# Altium schematic symbol library Schlib.SchLib: 725 symbols (part 5 of 6) (continued)
## SMAJ6.0A (continued)
SMAJ Series 10.3 V 0.4 kW Surface Mount Uni-Directional TVS Diode - DO-214AC; Manufacturer: Littelfuse; Manufacturer Part Number: SMAJ6.0A; Number of Channels: 1; Direction: Unidirectional; Clamping Voltage: 96.8V; Breakdown Voltage: 66.7V; Operating Supply Voltage: 60V; Max Surge Current: 4.1A; Reverse Standoff Voltage: 6V; Min Breakdown Voltage: 6.67V; Peak Pulse Power: 400W; Power Line Protection: No; Peak Pulse Current: 38.8A; Test Current: 1mA; Diode Type: ZENER; Max Power Dissipation: 3.3W; Max Breakdown Voltage: 7.37V; Leakage Current: 1uA; Current: 41A; Clamping Voltage-Max: 10.3V; Supplier: Future Electronics; Supplier Part Number: 9439142; RoHS: Yes; Category: TVS Diodes; Stock: 10000; Pricing: 5000=0.068, 15000=0.0655, 20000=0.0648, 50000=0.0628, 75000=0.0608 (USD); Mounting Technology: Surface Mount; Case/Package: DO-214AC; Pins: 2; Min Operating Temperature: -65°C; Max Operating Temperature: 150°C; Package Quantity: 5000; Packaging: Tape and Reel; Number of Unidirectional Channels: 1; Polarity: Unidirectional; Termination: SMD/SMT; Series: SMAJ; Voltage Rating (DC): 6V; Reverse Breakdown Voltage: 66.7V; Number of Elements: 1; Voltage: 60V; Power Dissipation: 400W; Length: 5.28mm; Width: 2.79mm; Height: 2.29mm; RoHS Compliant: Yes; Reach SVHC Compliant: No; Lead Free: Lead Free; ComponentLink1URL: https://datasheet.ciiva.com/28473/607617-28473464.pdf?src-supplier=Element14; ComponentLink1Description: https://datasheet.ciiva.com/28473/607617-28473464.pdf?src-supplier=Element14; ComponentLink2URL: https://datasheet.ciiva.com/330/littelfuse-tvs-diode-smaj-datasheet-pdf-330723.pdf?src-supplier=Digikey; ComponentLink2Description: https://datasheet.ciiva.com/330/littelfuse-tvs-diode-smaj-datasheet-pdf-330723.pdf?src-supplier=Digikey; ComponentLink3URL: https://datasheet.ciiva.com/330/littelfuse-tvs-diode-smaj-datasheet-pdf-330721.pdf?src-supplier=Digikey; ComponentLink3Description: https://datasheet.ciiva.com/330/littelfuse-tvs-diode-smaj-datasheet-pdf-330721.pdf?src-supplier=Digikey; ComponentLink4URL: https://datasheet.ciiva.com/16391/littelfuse-tvs-diode-smaj-16391801.pdf?src-supplier=Future+Electronics; ComponentLink4Description: https://datasheet.ciiva.com/16391/littelfuse-tvs-diode-smaj-16391801.pdf?src-supplier=Future+Electronics; ComponentLink5URL: https://datasheet.ciiva.com/330/littelfuse-tvs-diode-smaj-datasheet-pdf-330713.pdf?src-supplier=Digikey; ComponentLink5Description: https://datasheet.ciiva.com/330/littelfuse-tvs-diode-smaj-datasheet-pdf-330713.pdf?src-supplier=Digikey; ComponentLink6URL: https://datasheet.ciiva.com/330/littelfuse-tvs-diode-smaj-datasheet-pdf-330712.pdf?src-supplier=Digikey; ComponentLink6Description: https://datasheet.ciiva.com/330/littelfuse-tvs-diode-smaj-datasheet-pdf-330712.pdf?src-supplier=Digikey; ComponentLink7URL: https://datasheet.ciiva.com/16487/littelfuse-tvs-diode-smaj-16487499.pdf?src-supplier=Future+Electronics; ComponentLink7Description: https://datasheet.ciiva.com/16487/littelfuse-tvs-diode-smaj-16487499.pdf?src-supplier=Future+Electronics; ComponentLink8URL: https://datasheet.ciiva.com/330/littelfuse-tvs-diode-smaj-datasheet-pdf-330722.pdf?src-supplier=Digikey; ComponentLink8Description: https://datasheet.ciiva.com/330/littelfuse-tvs-diode-smaj-datasheet-pdf-330722.pdf?src-supplier=Digikey
footprint DO-214AC, SMA
pins: 1 C, 2 A

## SMAJ26CA
designator D?  (value not drawn)
SMAJ Series 42.1 V 0.4 kW Surface Mount Bi-Directional TVS Diode - DO-214AC; Manufacturer: Littelfuse; Manufacturer Part Number: SMAJ26CA; Reverse Standoff Voltage: 26V; Min Breakdown Voltage: 28.9V; Peak Pulse Power: 400W; Polarity: Bidirectional; Peak Pulse Current: 9.5A; Max Power Dissipation: 3.3W; Clamping Voltage: 42.1V; Test Current: 1mA; Max Breakdown Voltage: 31.9V; Number of Elements: 1; Leakage Current: 1uA; Power Line Protection: No; Diode Type: ZENER; Supplier: Future Electronics; Supplier Part Number: 8355760; RoHS: Yes; Category: TVS Diodes; Stock: 50000; Pricing: 5000=0.0746, 15000=0.0718, 20000=0.0711, 50000=0.0689, 75000=0.0667 (USD); Mounting Technology: Surface Mount; Case/Package: DO-214AC; Pins: 2; Min Operating Temperature: -65°C; Max Operating Temperature: 150°C; Packaging: Tape and Reel; Direction: Bidirectional; Reverse Breakdown Voltage: 28.9V; Number of Bidirectional Channels: 1; Power Dissipation: 400W; Voltage Rating (DC): 26V; Series: SMAJ; Clamping Voltage-Max: 42.1V; Length: 5.28mm; Width: 2.79mm; Height: 2.29mm; RoHS Compliant: Yes; Reach SVHC Compliant: No; Lead Free: Lead Free; ComponentLink1URL: https://datasheet.ciiva.com/331/littelfuse-tvs-diode-smaj-datasheet-pdf-331088.pdf?src-supplier=Digikey; ComponentLink1Description: https://datasheet.ciiva.com/331/littelfuse-tvs-diode-smaj-datasheet-pdf-331088.pdf?src-supplier=Digikey; ComponentLink2URL: https://datasheet.ciiva.com/331/littelfuse-tvs-diode-smaj-datasheet-pdf-331089.pdf?src-supplier=Digikey; ComponentLink2Description: https://datasheet.ciiva.com/331/littelfuse-tvs-diode-smaj-datasheet-pdf-331089.pdf?src-supplier=Digikey; ComponentLink3URL: https://datasheet.ciiva.com/331/littelfuse-tvs-diode-smaj-datasheet-pdf-331087.pdf?src-supplier=Digikey; ComponentLink3Description: https://datasheet.ciiva.com/331/littelfuse-tvs-diode-smaj-datasheet-pdf-331087.pdf?src-supplier=Digikey
footprint DO-214AC, SMA
pins: 1 C, 2 A

## SMAJ30A
designator *
Diode TVS Single Uni-Dir 30V 400W 2-Pin SMA; Manufacturer: Bourns; Manufacturer Part Number: SMAJ30A; Supplier: Digikey; Supplier Part Number: SMAJ30ABCT-ND; RoHS: Yes; Category: TVS Diodes; Stock: 6259; Pricing: 1=0.35, 10=0.233, 100=0.113, 500=0.1075, 1000=0.102 (USD); ComponentLink1URL: https://datasheet.ciiva.com/333/smaj-333554.pdf?src-supplier=Digikey; ComponentLink1Description: https://datasheet.ciiva.com/333/smaj-333554.pdf?src-supplier=Digikey; ComponentLink2URL: https://datasheet.ciiva.com/333/smaj-333555.pdf?src-supplier=Digikey; ComponentLink2Description: https://datasheet.ciiva.com/333/smaj-333555.pdf?src-supplier=Digikey; ComponentLink3URL: https://datasheet.ciiva.com/333/smaj-333556.pdf?src-supplier=Digikey; ComponentLink3Description: https://datasheet.ciiva.com/333/smaj-333556.pdf?src-supplier=Digikey; ComponentLink4URL: https://datasheet.ciiva.com/8199/smaj-8199689.pdf?src-supplier=Avnet; ComponentLink4Description: https://datasheet.ciiva.com/8199/smaj-8199689.pdf?src-supplier=Avnet; ComponentLink5URL: https://datasheet.ciiva.com/3021/smaj-3021390.pdf?src-supplier=Avnet; ComponentLink5Description: https://datasheet.ciiva.com/3021/smaj-3021390.pdf?src-supplier=Avnet; ComponentLink6URL: https://datasheet.ciiva.com/16237/smaj-16237422.pdf?src-supplier=Onlinecomponents.com; ComponentLink6Description: https://datasheet.ciiva.com/16237/smaj-16237422.pdf?src-supplier=Onlinecomponents.com; ComponentLink7URL: https://datasheet.ciiva.com/28409/1695388-28409902.pdf?src-supplier=Element14; ComponentLink7Description: https://datasheet.ciiva.com/28409/1695388-28409902.pdf?src-supplier=Element14; ComponentLink8URL: https://datasheet.ciiva.com/8031/1695388-8031049.pdf?src-supplier=Element14; ComponentLink8Description: https://datasheet.ciiva.com/8031/1695388-8031049.pdf?src-supplier=Element14

## SMAJ30A-TP
designator D?  (value not drawn)
TVS Diode Single Uni-Dir 30V 400W 2-Pin SMA T/R; Manufacturer: MCC; Manufacturer Part Number: SMAJ30A-TP; Reverse Breakdown Voltage: 33.3V; Max Surge Current: 8.3A; Number of Unidirectional Channels: 1; Clamping Voltage: 48.4V; Power Line Protection: No; Polarity: Unidirectional; Test Current: 1mA; Leakage Current: 1uA; Diode Type: ZENER; Supplier: Arrow Electronics; Supplier Part Number: SMAJ30A-TP; RoHS: Yes; Category: TVS Diodes; Stock: 10000; Pricing: 5000=0.0648, 10000=0.0535, 50000=0.0512 (USD); Mounting Technology: Surface Mount; Case/Package: DO-214AC; Pins: 2; Min Operating Temperature: -55°C; Max Operating Temperature: 150°C; Package Quantity: 5000; Packaging: Tape and Reel; Operating Supply Voltage: 30V; Reverse Standoff Voltage: 30V; Min Breakdown Voltage: 33.3V; Peak Pulse Power: 400W; Breakdown Voltage: 33.3V; Number of Channels: 1; Termination: SMD/SMT; Number of Elements: 1; Peak Pulse Current: 8.3A; Voltage Rating (DC): 30V; Series: -; Length: 4.6mm; Width: 2.9mm; Height: 2.44mm; Lead Free: Lead Free; RoHS Compliant: Yes; ComponentLink1URL: https://datasheet.ciiva.com/333/smaj5-0smaj440casma-333617.pdf?src-supplier=Digikey; ComponentLink1Description: https://datasheet.ciiva.com/333/smaj5-0smaj440casma-333617.pdf?src-supplier=Digikey; ComponentLink2URL: https://datasheet.ciiva.com/333/smaj5-0smaj440casma-333618.pdf?src-supplier=Digikey; ComponentLink2Description: https://datasheet.ciiva.com/333/smaj5-0smaj440casma-333618.pdf?src-supplier=Digikey; ComponentLink3URL: https://datasheet.ciiva.com/333/smaj5-0smaj440casma-333619.pdf?src-supplier=Digikey; ComponentLink3Description: https://datasheet.ciiva.com/333/smaj5-0smaj440casma-333619.pdf?src-supplier=Digikey
footprint DO-214AC, SMA
pins: 1 C, 2 A

## SMAJ30CA
designator D?  (value not drawn)
Dio Tvs Vwm 30V 400W Bidir Sma Rohs Compliant: Yes; Manufacturer: Bourns; Manufacturer Part Number: SMAJ30CA; Polarity: Bidirectional; Breakdown Voltage: 36.8V; Min Breakdown Voltage: 33.3V; Test Current: 1mA; Peak Pulse Current: 8.3A; Max Surge Current: 40A; Number of Bidirectional Channels: 1; Power Line Protection: No; Max Reverse Leakage Current: 5uA; Diode Type: ZENER; Operating Supply Voltage: 3.5V; Supplier: Rs; Supplier Part Number: 7673740P; RoHS: Yes; Category: TVS Diodes; Stock: 48677; Pricing: 500=0.17, 2500=0.104, 5000=0.102, 10000=0.099 (GBP); Mounting Technology: Surface Mount; Case/Package: DO-214AC; Pins: 2; Min Operating Temperature: -55°C; Max Operating Temperature: 150°C; Peak Pulse Power: 400W; Packaging: Tape and Reel; Reverse Standoff Voltage: 30V; Direction: Bidirectional; Package Quantity: 1; Series: SMAJ; Number of Channels: 1; Max Power Dissipation: 400W; Termination: SMD/SMT; Max Breakdown Voltage: 36.8V; ESD Protection: Yes; Length: 4.57mm; Width: 2.92mm; Height: 2.42mm; Radiation Hardening: No; RoHS Compliant: Yes; Reach SVHC Compliant: No; ComponentLink1URL: https://datasheet.ciiva.com/25624/0900766b8112213b-25624855.pdf?src-supplier=Rs; ComponentLink1Description: https://datasheet.ciiva.com/25624/0900766b8112213b-25624855.pdf?src-supplier=Rs; ComponentLink2URL: https://datasheet.ciiva.com/8031/1695388-8031052.pdf?src-supplier=Element14; ComponentLink2Description: https://datasheet.ciiva.com/8031/1695388-8031052.pdf?src-supplier=Element14; ComponentLink3URL: https://datasheet.ciiva.com/3023/smaj-3023089.pdf?src-supplier=Avnet; ComponentLink3Description: https://datasheet.ciiva.com/3023/smaj-3023089.pdf?src-supplier=Avnet; ComponentLink4URL: https://datasheet.ciiva.com/16237/smaj-16237423.pdf?src-supplier=Onlinecomponents.com; ComponentLink4Description: https://datasheet.ciiva.com/16237/smaj-16237423.pdf?src-supplier=Onlinecomponents.com; ComponentLink5URL: https://datasheet.ciiva.com/3021/smaj-3021391.pdf?src-supplier=Avnet; ComponentLink5Description: https://datasheet.ciiva.com/3021/smaj-3021391.pdf?src-supplier=Avnet; ComponentLink6URL: https://datasheet.ciiva.com/334/smaj-334475.pdf?src-supplier=Digi-Key; ComponentLink6Description: https://datasheet.ciiva.com/334/smaj-334475.pdf?src-supplier=Digi-Key; ComponentLink7URL: https://datasheet.ciiva.com/334/smaj-334476.pdf?src-supplier=Digi-Key; ComponentLink7Description: https://datasheet.ciiva.com/334/smaj-334476.pdf?src-supplier=Digi-Key; ComponentLink8URL: https://datasheet.ciiva.com/334/smaj-334474.pdf?src-supplier=Digi-Key; ComponentLink8Description: https://datasheet.ciiva.com/334/smaj-334474.pdf?src-supplier=Digi-Key
footprint DO-214AC, SMA
pins: 1 C, 2 A

## SMAJ60A-E3/61
designator D?  (value not drawn)
400 W 60 V Uni-Directional SMT Transient Voltage Suppressor Diode - DO-214AC; Manufacturer: Vishay Semiconductors; Manufacturer Part Number: SMAJ60A-E3/61; Voltage Rating (DC): 60V; Supplier: Rs; Supplier Part Number: 8141427; RoHS: Yes; Category: TVS Diodes; Stock: 12180; Pricing: 20=0.264, 200=0.214, 1000=0.19, 2000=0.148, 5000=0.131 (EUR); Lead Free: 5697LeadFree; ComponentLink1URL: https://datasheet.ciiva.com/15143/getdatasheetpartid-185225-15143901.pdf?src-supplier=Verical; ComponentLink1Description: https://datasheet.ciiva.com/15143/getdatasheetpartid-185225-15143901.pdf?src-supplier=Verical; ComponentLink2URL: https://datasheet.ciiva.com/26322/548547-26322565.pdf?src-supplier=Element14; ComponentLink2Description: https://datasheet.ciiva.com/26322/548547-26322565.pdf?src-supplier=Element14; ComponentLink3URL: https://datasheet.ciiva.com/16487/smaj50a-16487487.pdf?src-supplier=Future+Electronics; ComponentLink3Description: https://datasheet.ciiva.com/16487/smaj50a-16487487.pdf?src-supplier=Future+Electronics
footprint DO-214AC, SMA
pins: 1 C, 2 A

## SMBJ26CA
designator D?  (value not drawn)
Diode TVS Single Bi-Dir 26V 600W 2-Pin DO-214AA T/R; Manufacturer: Bourns; Manufacturer Part Number: SMBJ26CA; Supplier: Avnet; Supplier Part Number: SMBJ26CA; RoHS: Yes; Category: TVS Diodes; Stock: 18000; Pricing: 3000=0.0994, 6000=0.0973, 12000=0.0952, 18000=0.0931, 24000=0.091, 30000=0.0889, 300000=0.0875 (USD); Height: 2.44mm; ComponentLink1URL: https://datasheet.ciiva.com/3021/smbj-3021431.pdf?src-supplier=Avnet; ComponentLink1Description: https://datasheet.ciiva.com/3021/smbj-3021431.pdf?src-supplier=Avnet; ComponentLink2URL: https://datasheet.ciiva.com/3022/smbj-3022511.pdf?src-supplier=Avnet; ComponentLink2Description: https://datasheet.ciiva.com/3022/smbj-3022511.pdf?src-supplier=Avnet; ComponentLink3URL: https://datasheet.ciiva.com/4509/smbj-51809-4509304.pdf?src-supplier=Mouser; ComponentLink3Description: https://datasheet.ciiva.com/4509/smbj-51809-4509304.pdf?src-supplier=Mouser; ComponentLink4URL: https://datasheet.ciiva.com/334/smbj-334676.pdf?src-supplier=Digikey; ComponentLink4Description: https://datasheet.ciiva.com/334/smbj-334676.pdf?src-supplier=Digikey; ComponentLink5URL: https://datasheet.ciiva.com/334/smbj-334677.pdf?src-supplier=Digikey; ComponentLink5Description: https://datasheet.ciiva.com/334/smbj-334677.pdf?src-supplier=Digikey; ComponentLink6URL: https://datasheet.ciiva.com/334/smbj-334678.pdf?src-supplier=Digikey; ComponentLink6Description: https://datasheet.ciiva.com/334/smbj-334678.pdf?src-supplier=Digikey; ComponentLink7URL: https://datasheet.ciiva.com/8031/1677318-8031151.pdf?src-supplier=Element14; ComponentLink7Description: https://datasheet.ciiva.com/8031/1677318-8031151.pdf?src-supplier=Element14; ComponentLink8URL: https://datasheet.ciiva.com/16237/smbj-16237495.pdf?src-supplier=Onlinecomponents.com; ComponentLink8Description: https://datasheet.ciiva.com/16237/smbj-16237495.pdf?src-supplier=Onlinecomponents.com
footprint DO-214AA_SMB
pins: 1 C, 2 A

## SMBJ30CAHE3/52
designator D?  (value not drawn)
Diode TVS Single Bi-Dir 30V 600W 2-Pin DO-214AA T/R; Manufacturer: Vishay Semiconductors; Manufacturer Part Number: SMBJ30CAHE3/52; Direction: Bidirectional; Min Breakdown Voltage: 33.3V; Max Reverse Leakage Current: 1uA; Test Current: 1mA; Peak Pulse Current: 12.4A; Clamping Voltage: 48.4V; Number of Bidirectional Channels: 1; Power Line Protection: No; Diode Type: ZENER; Max Surge Current: 100A; Supplier: Digikey; Supplier Part Number: SMBJ30CAHE3/52GIDKR-ND; RoHS: Yes; Category: TVS Diodes; Mounting Technology: Surface Mount; Case/Package: DO-214AA; Pins: 2; Min Operating Temperature: -55°C; Max Operating Temperature: 150°C; Packaging: Tape and Reel; Peak Pulse Power: 600W; Reverse Standoff Voltage: 30V; Polarity: Bidirectional; Series: Automotive, AEC-Q101, TransZorb®; Package Quantity: 750; Operating Supply Voltage: 30V; Breakdown Voltage: 33.3V; Number of Channels: 1; Termination: SMD/SMT; RoHS Compliant: Yes; ComponentLink1URL: https://datasheet.ciiva.com/347/smbj50a-347563.pdf?src-supplier=Digikey; ComponentLink1Description: https://datasheet.ciiva.com/347/smbj50a-347563.pdf?src-supplier=Digikey
footprint DO-214AC, SMA
pins: 1 C, 2 A

## SMF5.0CA
designator D?  (value not drawn)
Transient Voltage Suppressor diode, SOD-123FL, 6.40V .. 7.00V, 200W; Manufacturer: Diotec; Manufacturer Part Number: SMF5.0CA; Supplier: Mouser; Supplier Part Number: 637-SMF5.0CA; RoHS: Yes; Category: TVS Diodes; Stock: 2535; Pricing: 1=0.61, 10=0.426, 50=0.426, 100=0.265, 1000=0.234, 10000=0.095 (USD); ComponentLink1URL: https://datasheet.octopart.com/SMF5.0CA-Diotec-datasheet-155920028.pdf?src-supplier=TME; ComponentLink1Description: https://datasheet.octopart.com/SMF5.0CA-Diotec-datasheet-155920028.pdf?src-supplier=TME
footprint SOD-123F
pins: 1 C, 2 A

## SMF6.0A
designator D?  (value not drawn)
SMF Series 7.37 V Uni-Directional Surface Mount TVS Diode - SOD-123F; Manufacturer: Diotec; Manufacturer Part Number: SMF6.0A; Supplier: Mouser; Supplier Part Number: 637-SMF6.0A; RoHS: Yes; Category: TVS Diodes; Stock: 1735; Pricing: 1=0.25, 10=0.134, 50=0.134, 100=0.087, 1000=0.051, 10000=0.032 (USD); ComponentLink1URL: https://datasheet.octopart.com/SMF6.0A-Diotec-datasheet-155920028.pdf?src-supplier=TME; ComponentLink1Description: https://datasheet.octopart.com/SMF6.0A-Diotec-datasheet-155920028.pdf?src-supplier=TME
footprint SOD-123F
pins: 1 C, 2 A

## SMF6.0CA
designator D?  (value not drawn)
Diode TVS Single Bi-Dir 6V 1000W 2-Pin SOD-123FL T/R; Manufacturer: Littelfuse; Manufacturer Part Number: SMF6.0CA; Supplier: Digi-Key; Supplier Part Number: 18-SMF6.0CACT-ND; RoHS: Yes; Category: TVS Diodes; Stock: 7686; Pricing: 1=0.43, 10=0.352, 100=0.2399, 500=0.17992, 1000=0.13495 (USD)
footprint SOD-123F
pins: 1 C, 2 A

## SMF18CA-TP
designator D?  (value not drawn)
TVS Diode Single Bi-Dir 18V 200W 2-Pin SOD-123FL T/R; Manufacturer: MCC; Manufacturer Part Number: SMF18CA-TP; Supplier: Verical; Supplier Part Number: SMF18CA-TP; RoHS: Yes; Stock: 15000; Pricing: 2500=0.0616, 50000=0.0585, 100000=0.0567 (USD); ComponentLink1URL: http://components.arrow.com/part/dataview/49208193S300830N2022?src-supplier=Arrow+Electronics; ComponentLink1Description: http://components.arrow.com/part/dataview/49208193S300830N2022?src-supplier=Arrow+Electronics; ComponentLink2URL: https://datasheet.octopart.com/SMF18CA-TP-MCC-datasheet-136499538.pdf?src-supplier=TME; ComponentLink2Description: https://datasheet.octopart.com/SMF18CA-TP-MCC-datasheet-136499538.pdf?src-supplier=TME
footprint SOD-123F
pins: 1 C, 2 A

## SMF20CA
designator D?  (value not drawn)
TVS Diode, SOD-123FL, 20.0V, 200W, Bidir; Manufacturer: Diotec; Manufacturer Part Number: SMF20CA; Supplier: Mouser; Supplier Part Number: 637-SMF20CA; RoHS: No; Stock: 4391; Pricing: 1=0.32, 10=0.318, 50=0.318, 100=0.318, 1000=0.215, 10000=0.072 (USD); ComponentLink1URL: http://datasheet.octopart.com/SMF20CA-Diotec-datasheet-155920028.pdf?src-supplier=Mouser; ComponentLink1Description: http://datasheet.octopart.com/SMF20CA-Diotec-datasheet-155920028.pdf?src-supplier=Mouser; ComponentLink2URL: http://datasheet.octopart.com/SMF20CA-Diotec-datasheet-155920028.pdf?src-supplier=Onlinecomponents.com; ComponentLink2Description: http://datasheet.octopart.com/SMF20CA-Diotec-datasheet-155920028.pdf?src-supplier=Onlinecomponents.com; ComponentLink3URL: http://datasheet.octopart.com/SMF20CA-Diotec-datasheet-155920028.pdf?src-supplier=Electro+Sonic; ComponentLink3Description: http://datasheet.octopart.com/SMF20CA-Diotec-datasheet-155920028.pdf?src-supplier=Electro+Sonic; ComponentLink4URL: http://datasheet.octopart.com/SMF20CA-Diotec-datasheet-155920028.pdf?src-supplier=DComponents; ComponentLink4Description: http://datasheet.octopart.com/SMF20CA-Diotec-datasheet-155920028.pdf?src-supplier=DComponents; ComponentLink5URL: https://datasheet.octopart.com/SMF20CA-Diotec-datasheet-155920028.pdf?src-supplier=TME; ComponentLink5Description: https://datasheet.octopart.com/SMF20CA-Diotec-datasheet-155920028.pdf?src-supplier=TME
footprint SOD-123F
pins: 1 C, 2 A

## SMF24CA
designator D?  (value not drawn)
38.9V Clamp 5.1A Ipp Tvs Diode Surface Mount SOD-123F; Manufacturer: Diotec; Manufacturer Part Number: SMF24CA; Supplier: Mouser; Supplier Part Number: 637-SMF24CA; RoHS: No; Stock: 8407; Pricing: 1=0.6, 10=0.425, 50=0.425, 100=0.264, 1000=0.233, 10000=0.095 (USD); ComponentLink1URL: http://datasheet.octopart.com/SMF24CA-Diotec-datasheet-155920028.pdf?src-supplier=Onlinecomponents.com; ComponentLink1Description: http://datasheet.octopart.com/SMF24CA-Diotec-datasheet-155920028.pdf?src-supplier=Onlinecomponents.com; ComponentLink2URL: http://datasheet.octopart.com/SMF24CA-Diotec-datasheet-155920028.pdf?src-supplier=Mouser; ComponentLink2Description: http://datasheet.octopart.com/SMF24CA-Diotec-datasheet-155920028.pdf?src-supplier=Mouser; ComponentLink3URL: https://datasheet.octopart.com/SMF24CA-Diotec-datasheet-155920028.pdf?src-supplier=TME; ComponentLink3Description: https://datasheet.octopart.com/SMF24CA-Diotec-datasheet-155920028.pdf?src-supplier=TME; ComponentLink4URL: http://datasheet.octopart.com/SMF24CA-Diotec-datasheet-155920028.pdf?src-supplier=DComponents; ComponentLink4Description: http://datasheet.octopart.com/SMF24CA-Diotec-datasheet-155920028.pdf?src-supplier=DComponents; ComponentLink5URL: http://datasheet.octopart.com/SMF24CA-Diotec-datasheet-155920028.pdf?src-supplier=Electro+Sonic; ComponentLink5Description: http://datasheet.octopart.com/SMF24CA-Diotec-datasheet-155920028.pdf?src-supplier=Electro+Sonic
footprint SOD-123F
pins: 1 C, 2 A

## SMF30A
designator D?  (value not drawn)
Diode TVS Single Uni-Dir 30V 200W 2-Pin SOD-123F T/R; Manufacturer: Littelfuse; Manufacturer Part Number: SMF30A; Peak Pulse Current: 4.1A; Number of Unidirectional Channels: 1; Min Breakdown Voltage: 33.3V; Power Line Protection: No; Diode Type: ZENER; Clamping Voltage: 48.4V; Breakdown Voltage: 36.8V; Polarity: Unidirectional; Supplier: Future Electronics; Supplier Part Number: 4083400; RoHS: Yes; Category: TVS Diodes; Stock: 75000; Pricing: 3000=0.0941, 9000=0.0905, 15000=0.0889, 30000=0.0867, 60000=0.0834 (USD); Mounting Technology: Surface Mount; Pins: 2; Min Operating Temperature: -55°C; Max Operating Temperature: 150°C; Packaging: Tape and Reel; Reverse Standoff Voltage: 30V; Peak Pulse Power: 200W; Series: SMF; Number of Channels: 1; Max Surge Current: 4.1A; Termination: SMD/SMT; Max Breakdown Voltage: 36.8V; RoHS Compliant: Yes; Lead Free: Lead Free; Reach SVHC Compliant: Unknown; ComponentLink1URL: https://datasheet.ciiva.com/6578/littelfuse-tvs-diode-smf-datasheet-pdf-6578351.pdf?src-supplier=Digi-Key; ComponentLink1Description: https://datasheet.ciiva.com/6578/littelfuse-tvs-diode-smf-datasheet-pdf-6578351.pdf?src-supplier=Digi-Key
footprint SOD-123F
pins: 1 C, 2 A

## SMF51A
designator D?  (value not drawn)
SMF Series 200 W 51 V Uni-Directional Surface Mount TVS Diode - SOD-123F; Manufacturer: Littelfuse; Manufacturer Part Number: SMF51A; Test Current: 1mA; Max Reverse Leakage Current: 1uA; Max Breakdown Voltage: 62.7V; Reverse Voltage: 51V; Supplier: Digikey; Supplier Part Number: F5833CT-ND; RoHS: Yes; Category: TVS Diodes; Stock: 20274; Pricing: 1=0.35, 10=0.239, 100=0.11, 500=0.106, 1000=0.102, 3000=0.079, 6000=0.076, 9000=0.072 (USD); ComponentLink1URL: http://www.mouser.com/ds/2/240/Littelfuse_TVS_Diode_SMF_Datasheet-370132.pdf?src-supplier=Mouser; ComponentLink1Description: http://www.mouser.com/ds/2/240/Littelfuse_TVS_Diode_SMF_Datasheet-370132.pdf?src-supplier=Mouser; ComponentLink2URL: http://www.farnell.com/datasheets/2183286.pdf?src-supplier=Farnell; ComponentLink2Description: http://www.farnell.com/datasheets/2183286.pdf?src-supplier=Farnell; ComponentLink3URL: http://datasheet.octopart.com/SMF51A-Littelfuse-datasheet-68508998.pdf?src-supplier=Digikey; ComponentLink3Description: http://datasheet.octopart.com/SMF51A-Littelfuse-datasheet-68508998.pdf?src-supplier=Digikey; ComponentLink4URL: http://www.littelfuse.com/~/media/electronics/datasheets/tvs_diodes/littelfuse_tvs_diode_smf_datasheet.pdf.pdf?src-supplier=Digikey; ComponentLink4Description: http://www.littelfuse.com/~/media/electronics/datasheets/tvs_diodes/littelfuse_tvs_diode_smf_datasheet.pdf.pdf?src-supplier=Digikey; ComponentLink5URL: https://datasheet.octopart.com/SMF51A-Littelfuse-datasheet-68508998.pdf?src-supplier=Element14; ComponentLink5Description: https://datasheet.octopart.com/SMF51A-Littelfuse-datasheet-68508998.pdf?src-supplier=Element14; ComponentLink6URL: https://datasheet.octopart.com/SMF51A-Littelfuse-datasheet-32031221.pdf?src-supplier=Future+Electronics; ComponentLink6Description: https://datasheet.octopart.com/SMF51A-Littelfuse-datasheet-32031221.pdf?src-supplier=Future+Electronics; ComponentLink7URL: http://datasheet.octopart.com/SMF51A-Littelfuse-datasheet-68508998.pdf?src-supplier=Arrow+Electronics; ComponentLink7Description: http://datasheet.octopart.com/SMF51A-Littelfuse-datasheet-68508998.pdf?src-supplier=Arrow+Electronics; ComponentLink8URL: http://www.farnell.com/datasheets/2183286.pdf?src-supplier=Newark; ComponentLink8Description: http://www.farnell.com/datasheets/2183286.pdf?src-supplier=Newark; ComponentLink9URL: http://datasheet.octopart.com/SMF51A-Littelfuse-datasheet-68508998.pdf?src-supplier=Newark; ComponentLink9Description: http://datasheet.octopart.com/SMF51A-Littelfuse-datasheet-68508998.pdf?src-supplier=Newark; ComponentLink10URL: http://datasheet.octopart.com/SMF51A-Littelfuse-datasheet-68508998.pdf?src-supplier=LCSC; ComponentLink10Description: http://datasheet.octopart.com/SMF51A-Littelfuse-datasheet-68508998.pdf?src-supplier=LCSC; ComponentLink11URL: http://datasheet.octopart.com/SMF51A-Littelfuse-datasheet-68508998.pdf?src-supplier=TTI; ComponentLink11Description: http://datasheet.octopart.com/SMF51A-Littelfuse-datasheet-68508998.pdf?src-supplier=TTI
footprint SOD-123F
pins: 1 C, 2 A

## SMT-0540-T-9-R
designator *
Transducer Magnetic 3V 5X5MM SMD; Manufacturer: Projects Unlimited; Manufacturer Part Number: SMT-0540-T-9-R; Supplier: Mouser; Supplier Part Number: 665-SMT0540T9R; RoHS: No; Category: Audio Products; Stock: 2967; Pricing: 1=1.68000, 10=1.39000, 50=1.21000, 100=1.14000, 1000=0.93200, 10000=0.91400 (USD)

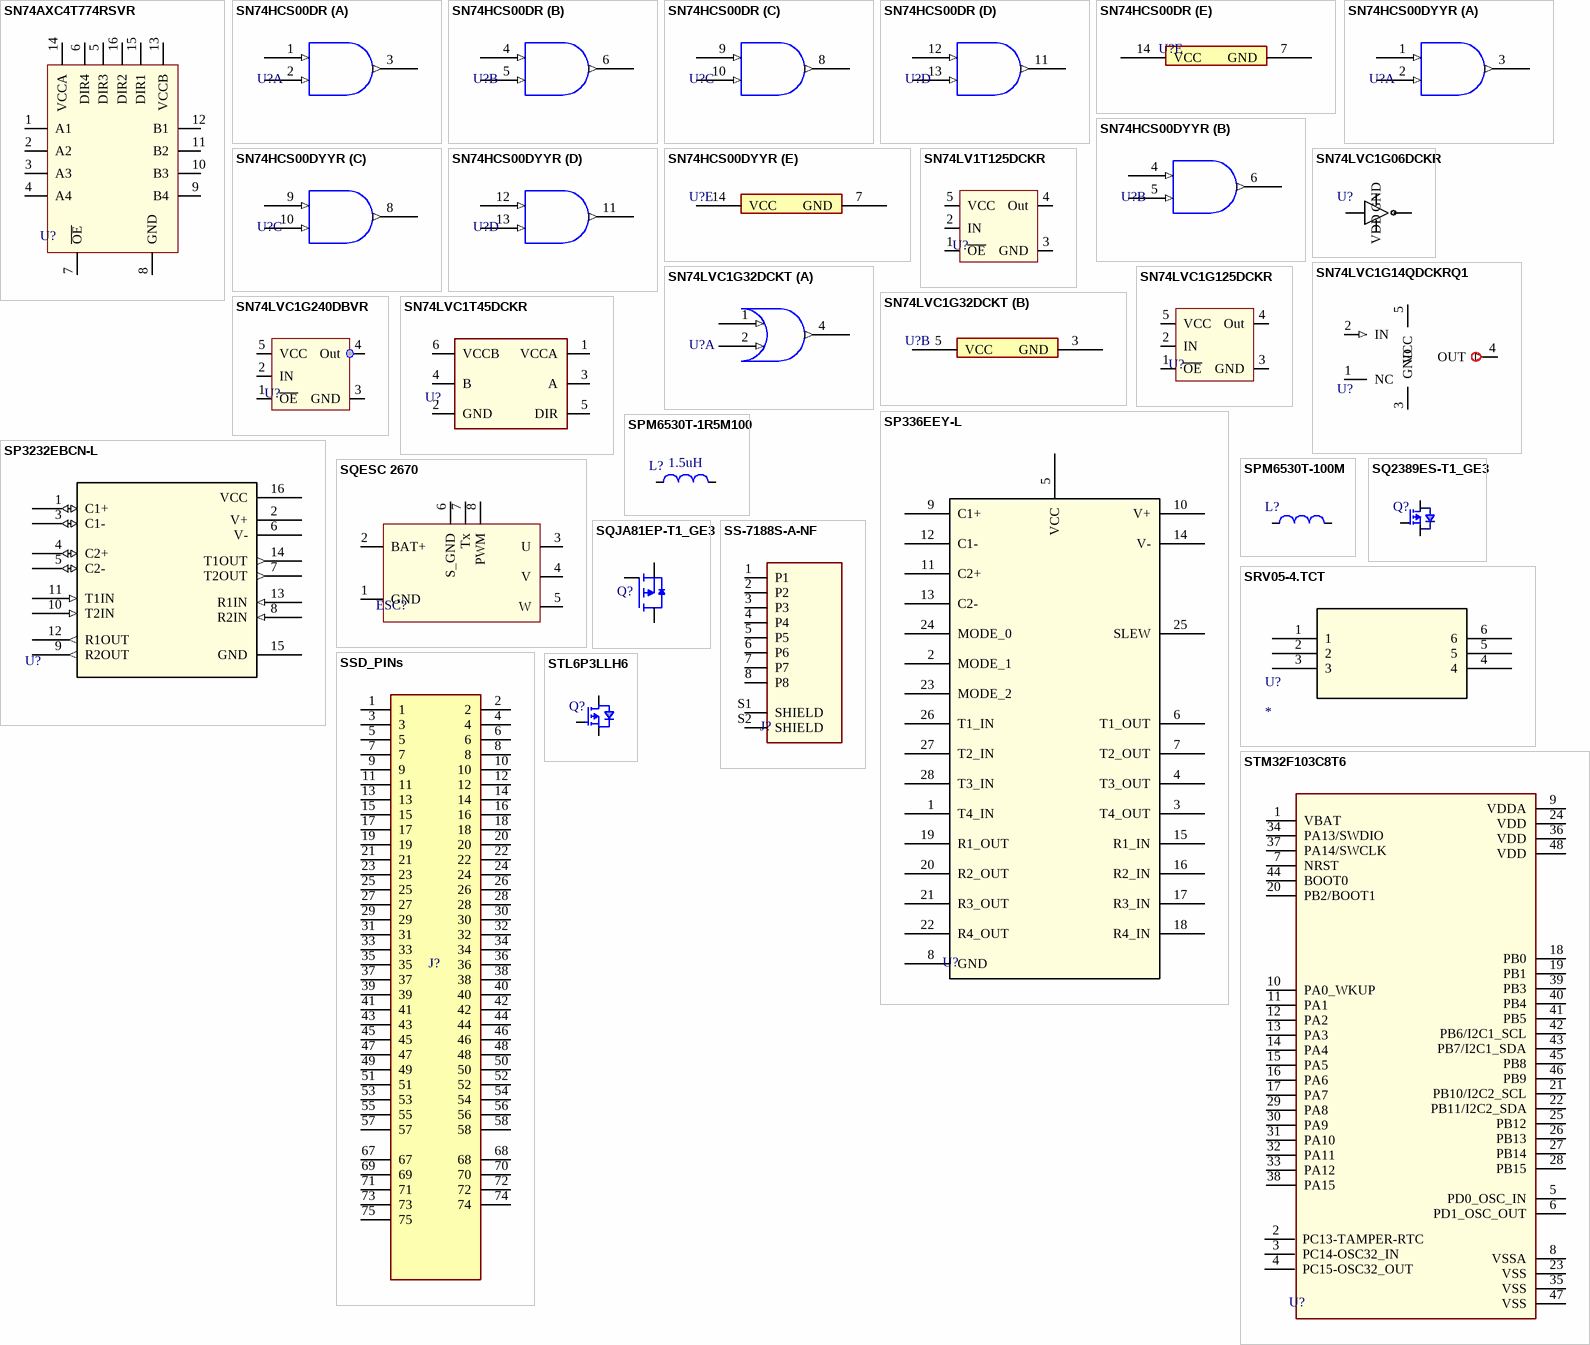
[diagram p18: symbols SN74AXC4T774RSVR to STM32F103C8T6]

## SN74AXC4T774RSVR
designator U?  (value not drawn)
4-bit dual-supply bus transceiver with 3-state outputs and independent direction control inputs 16-UQFN -40 to 125; Manufacturer: Texas Instruments; Manufacturer Part Number: SN74AXC4T774RSVR; Supplier 1: Digi-Key; RoHS: Yes; Category: Voltage Level Shifters; Stock 1: 27723; Pricing 1: 1=1.49000, 10=1.33500, 25=1.26720, 100=1.04100, 250=0.97312, 500=0.85998, 1000=0.67893 (USD); ComponentLink1URL: http://www.ti.com/general/docs/suppproductinfo.tsp?distId=10&amp;gotoUrl=http%3A%2F%2Fwww.ti.com%2Flit%2Fgpn%2Fsn74axc4t774&src-supplier=Digi-Key; ComponentLink1Description: http://www.ti.com/general/docs/suppproductinfo.tsp?distId=10&amp;gotoUrl=http%3A%2F%2Fwww.ti.com%2Flit%2Fgpn%2Fsn74axc4t774&src-supplier=Digi-Key; Supplier Part Number 1: 296-SN74AXC4T774RSVRCT-ND
footprint SN74AXC4T774RSVR
pins: 1 A1, 2 A2, 3 A3, 4 A4, 5 DIR3, 6 DIR4, 7 ~{OE}, 8 GND, 9 B4, 10 B3, 11 B2, 12 B1, 13 VCCB, 14 VCCA, 15 DIR1, 16 DIR2

## SN74HCS00DR
designator U?
4-ch, 2-input, 2-V to 6-V low power NAND gates with Schmitt-trigger inputs 14-SOIC -40 to 125; Manufacturer: Texas Instruments; Manufacturer Part Number: SN74HCS00DR; Manufacturer Lifecycle Status: ACTIVE; Supplier: Mouser; Supplier Part Number: 595-SN74HCS00DR; RoHS: Compliant; Category: Logic Gates; Stock: 6987; Pricing: 1=0.49, 10=0.342, 50=0.306, 100=0.265, 1000=0.227, 10000=0.205 (USD); Case/Package: SOIC; Height: 0m; Length: 8.65mm; Lifecycle Status: Production; Pins: 14; Thickness: 1.58mm; Width: 3.91mm; ComponentLink1URL: https://sigma.octopart.com:443/182471030/technical_drawing/Texas-Instruments-SN74HCS00DR.pdf?src-supplier=Texas+Instruments; ComponentLink1Description: https://sigma.octopart.com:443/182471030/technical_drawing/Texas-Instruments-SN74HCS00DR.pdf?src-supplier=Texas+Instruments; ComponentLink2URL: https://octopart.com:443/opatz8j6/c1?t=OK14g7H3incUNed1GC2FmLXZX_lVihb0VA9VA2M02EfhKY7Y94NoRgparx-GhwZztdg65Bsc3MiavgiTniYLOSUbm8mZzGIU70JQcTbyrEsy0z-Cu6KoiXZ_XwD20LmgepbAALutHmLKbRIqbVVhjVXZx60sRbJy0hIxps6KEDeFhfvNyS3MEr_Yo5IvxHM7oB_83x7oHqPaiGulMKrJS5_6OUNxrLRnv4svvzIWZ3tf8x9ME8p_xCWpVFMfiJgRT1sYHWo4-Y20fZuOq_0BwmmfqQEnmCBY6u-TGByjKPCvSkZK84yoSwsRKckQmdGwdlCYGl0N4qFf4yg00NBL2w561-YHZcL6807wBwxYD4CTNHdmOUm1gKXXjGbu2fZ7mpSR9mbipw&src-supplier=Texas+Instruments; ComponentLink2Description: https://octopart.com:443/opatz8j6/c1?t=OK14g7H3incUNed1GC2FmLXZX_lVihb0VA9VA2M02EfhKY7Y94NoRgparx-GhwZztdg65Bsc3MiavgiTniYLOSUbm8mZzGIU70JQcTbyrEsy0z-Cu6KoiXZ_XwD20LmgepbAALutHmLKbRIqbVVhjVXZx60sRbJy0hIxps6KEDeFhfvNyS3MEr_Yo5IvxHM7oB_83x7oHqPaiGulMKrJS5_6OUNxrLRnv4svvzIWZ3tf8x9ME8p_xCWpVFMfiJgRT1sYHWo4-Y20fZuOq_0BwmmfqQEnmCBY6u-TGByjKPCvSkZK84yoSwsRKckQmdGwdlCYGl0N4qFf4yg00NBL2w561-YHZcL6807wBwxYD4CTNHdmOUm1gKXXjGbu2fZ7mpSR9mbipw&src-supplier=Texas+Instruments; ComponentLink3URL: https://sigma.octopart.com:443/49249646/technical_drawing/Texas-Instruments-SN74HCS00DR.pdf?src-supplier=Texas+Instruments; ComponentLink3Description: https://sigma.octopart.com:443/49249646/technical_drawing/Texas-Instruments-SN74HCS00DR.pdf?src-supplier=Texas+Instruments; ComponentLink4URL: https://datasheet.octopart.com:443/SN74HCS00DR-Texas-Instruments-datasheet-164417370.pdf?src-supplier=Augswan; ComponentLink4Description: https://datasheet.octopart.com:443/SN74HCS00DR-Texas-Instruments-datasheet-164417370.pdf?src-supplier=Augswan; ComponentLink5URL: http://sigma.octopart.com:80/reach_statement/Texas-Instruments-company-64.pdf?src-supplier=Compliance+Statements; ComponentLink5Description: http://sigma.octopart.com:80/reach_statement/Texas-Instruments-company-64.pdf?src-supplier=Compliance+Statements; ComponentLink6URL: http://sigma.octopart.com:80/conflict_mineral_statement/Texas-Instruments-company-63.pdf?src-supplier=Compliance+Statements; ComponentLink6Description: http://sigma.octopart.com:80/conflict_mineral_statement/Texas-Instruments-company-63.pdf?src-supplier=Compliance+Statements
footprint SOIC127P600X175-14N
part A pins: 1 (in), 2 (in), 3 (out)
part B pins: 4 (in), 5 (in), 6 (out)
part C pins: 8 (out), 9 (in), 10 (in)
part D pins: 11 (out), 12 (in), 13 (in)
part E pins: 7 GND, 14 VCC

## SN74HCS00DYYR
designator U?
IC GATE NAND 4CH 2-INP 14SOT23 NAND Gate IC 4 Channel Schmitt Trigger Input 14-SOT-23-THIN; Manufacturer: Texas Instruments; Manufacturer Part Number: SN74HCS00DYYR; Manufacturer Lifecycle Status: ACTIVE; Supplier: Mouser; Supplier Part Number: 595-SN74HCS00DYYR; RoHS: Compliant; Category: Logic Gates; Stock: 9005; Pricing: 1=0.71, 10=0.427, 50=0.367, 100=0.287, 1000=0.179, 10000=0.13 (USD); Height: 1.1mm; Length: 4.2mm; Lifecycle Status: Production; Pins: 14; Thickness: 950µm; Width: 2mm; ComponentLink1URL: https://sigma.octopart.com:443/182665539/technical_drawing/Texas-Instruments-SN74HCS00DYYR.pdf?src-supplier=Texas+Instruments; ComponentLink1Description: https://sigma.octopart.com:443/182665539/technical_drawing/Texas-Instruments-SN74HCS00DYYR.pdf?src-supplier=Texas+Instruments; ComponentLink2URL: https://octopart.com:443/opatz8j6/c1?t=tmE6-Lc4zJ66LnVqsBWELfcaZBtoOnzgGriNSQ8p8CXv2H0SvSpI_1d9rmyeN5oTv8TVcLDasDluNxdsl50tK2MBXcyJP1NpscXdOOsS-o0_LWDUbO19lsy45Gd7tkCQUr42B5FinIsUzoS4SFEVlc6iANrZCE0I4hPEoXioMxGxN6KtFRve5AliFWP0wbTDPNPl2kmsyoF3dbxlICkShptwnftZu_sYPtiH_yVOMfubxiQlEs4LCT7tSghXkz-rd6mlsuEVCjBbKz-t9UCvVoDfPb3Uf2WCkmOHBnT3RduGy5VewK4zbjLT_3ihlZhysKEDM_TIa6Ytpi_445yWJTVx67RnLEqMSQF8ZXItNLYgBgOgDhzoziVja-Yh3Ytco7WzyTov7A&src-supplier=Texas+Instruments; ComponentLink2Description: https://octopart.com:443/opatz8j6/c1?t=tmE6-Lc4zJ66LnVqsBWELfcaZBtoOnzgGriNSQ8p8CXv2H0SvSpI_1d9rmyeN5oTv8TVcLDasDluNxdsl50tK2MBXcyJP1NpscXdOOsS-o0_LWDUbO19lsy45Gd7tkCQUr42B5FinIsUzoS4SFEVlc6iANrZCE0I4hPEoXioMxGxN6KtFRve5AliFWP0wbTDPNPl2kmsyoF3dbxlICkShptwnftZu_sYPtiH_yVOMfubxiQlEs4LCT7tSghXkz-rd6mlsuEVCjBbKz-t9UCvVoDfPb3Uf2WCkmOHBnT3RduGy5VewK4zbjLT_3ihlZhysKEDM_TIa6Ytpi_445yWJTVx67RnLEqMSQF8ZXItNLYgBgOgDhzoziVja-Yh3Ytco7WzyTov7A&src-supplier=Texas+Instruments; ComponentLink3URL: https://sigma.octopart.com:443/178868997/technical_drawing/Texas-Instruments-SN74HCS00DYYR.pdf?src-supplier=Texas+Instruments; ComponentLink3Description: https://sigma.octopart.com:443/178868997/technical_drawing/Texas-Instruments-SN74HCS00DYYR.pdf?src-supplier=Texas+Instruments; ComponentLink4URL: https://sigma.octopart.com:443/155892991/technical_drawing/Texas-Instruments-SN74HCS00DYYR.pdf?src-supplier=Texas+Instruments; ComponentLink4Description: https://sigma.octopart.com:443/155892991/technical_drawing/Texas-Instruments-SN74HCS00DYYR.pdf?src-supplier=Texas+Instruments; ComponentLink5URL: https://datasheet.octopart.com:443/SN74HCS00DYYR-Texas-Instruments-datasheet-164417370.pdf?src-supplier=SHENGYU+ELECTRONICS; ComponentLink5Description: https://datasheet.octopart.com:443/SN74HCS00DYYR-Texas-Instruments-datasheet-164417370.pdf?src-supplier=SHENGYU+ELECTRONICS; ComponentLink6URL: http://sigma.octopart.com:80/reach_statement/Texas-Instruments-company-64.pdf?src-supplier=Compliance+Statements; ComponentLink6Description: http://sigma.octopart.com:80/reach_statement/Texas-Instruments-company-64.pdf?src-supplier=Compliance+Statements; ComponentLink7URL: http://sigma.octopart.com:80/conflict_mineral_statement/Texas-Instruments-company-63.pdf?src-supplier=Compliance+Statements; ComponentLink7Description: http://sigma.octopart.com:80/conflict_mineral_statement/Texas-Instruments-company-63.pdf?src-supplier=Compliance+Statements
footprint SOT23_DYY_TEX
part A pins: 1 (in), 2 (in), 3 (out)
part B pins: 4 (in), 5 (in), 6 (out)
part C pins: 8 (out), 9 (in), 10 (in)
part D pins: 11 (out), 12 (in), 13 (in)
part E pins: 7 GND, 14 VCC

## SN74LV1T125DCKR
designator U?  (value not drawn)
Single Power Supply, Single BUFFER GATE w/ 3-State Output (active low enable) 5-SC70 -40 to 125; Manufacturer: Texas Instruments; Manufacturer Part Number: SN74LV1T125DCKR; Supplier: Mouser; Supplier Part Number: 595-SN74LV1T125DCKR; RoHS: Yes; Category: Buffers, Drivers and Transceivers; Stock: 85907; Pricing: 1=0.41, 10=0.326, 50=0.326, 100=0.243, 1000=0.158, 10000=0.125 (USD); ComponentLink1URL: https://datasheet.ciiva.com/29634/sn74lv1t125-29634365.pdf?src-supplier=Digi-Key; ComponentLink1Description: https://datasheet.ciiva.com/29634/sn74lv1t125-29634365.pdf?src-supplier=Digi-Key; ComponentLink2URL: https://datasheet.ciiva.com/29634/sn74lv1t125-29634366.pdf?src-supplier=Digi-Key; ComponentLink2Description: https://datasheet.ciiva.com/29634/sn74lv1t125-29634366.pdf?src-supplier=Digi-Key; ComponentLink3URL: https://datasheet.ciiva.com/29634/sn74lv1t125-29634367.pdf?src-supplier=Digi-Key; ComponentLink3Description: https://datasheet.ciiva.com/29634/sn74lv1t125-29634367.pdf?src-supplier=Digi-Key; ComponentLink4URL: https://datasheet.ciiva.com/30038/sn74lv1t125-30038268.pdf?src-supplier=Avnet; ComponentLink4Description: https://datasheet.ciiva.com/30038/sn74lv1t125-30038268.pdf?src-supplier=Avnet
footprint SC-70-5
pins: 1 ~{OE}, 2 IN, 3 GND, 4 Out, 5 VCC
